# Altium footprint library shared_lib.PcbLib: 65 footprints (part 5 of 5)
Each footprint in its own frame and in the unit in brackets; x right, y up, seen from the top. Pads: shape width x height; smd on the part's side, far side on the other; paste and mask are expansions set on the pad; w line width, h text height; cw(c..) or ccw(c..) is an arc to the next point about the centre after c.
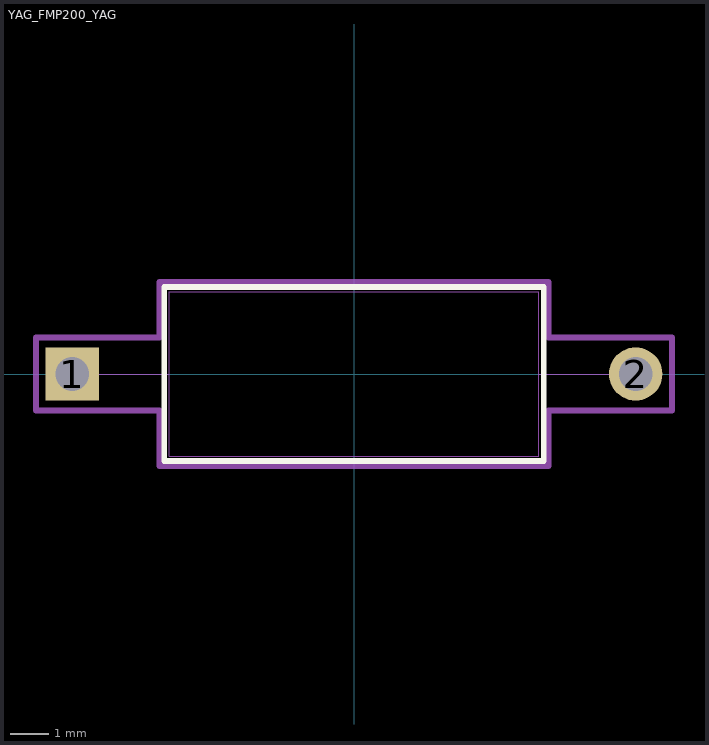
[diagram p4: the footprint, top view; thin cyan lines are the x and y axes]

## YAG_FMP200_YAG [mil]
pads (2):
  rect 54x54 hole 34 paste-99999 mask+0: 1(-285,0)
  round 54 hole 34 paste-99999 mask+0: 2(285,0)
Top Overlay:
  lines w6: -192,-88 -192,88 192,88 192,-88 -192,-88
Mechanical 13:
  lines w1: -285,0 -187,0 ; 187,0 285,0 ; -187,-83 -187,83 187,83 187,-83 -187,-83
Mechanical 15:
  lines w6: -322,-37 -197,-37 -197,-93 197,-93 197,-37 322,-37 322,37 197,37 197,93 -197,93 -197,37 -322,37 -322,-37
3D body "YAG_FMP200_YAG.step": height 165.51, standoff -110, extent -297.01,-82.88 297.01,82.88